# Altium footprint library PLC1.PcbLib: 118 footprints (part 8 of 8)
Each footprint in its own frame and in the unit in brackets; x right, y up, seen from the top. Pads: shape width x height; smd on the part's side, far side on the other; paste and mask are expansions set on the pad; w line width, h text height; cw(c..) or ccw(c..) is an arc to the next point about the centre after c.
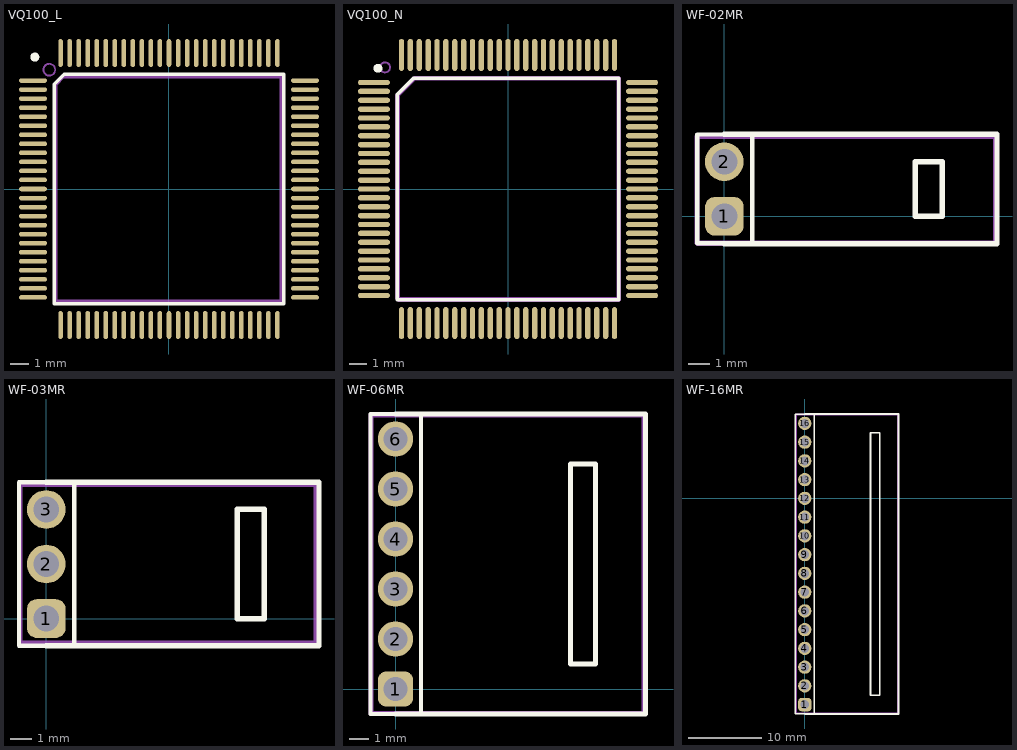
[diagram p7: the footprints below, top view; thin cyan lines are the x and y axes]

## VQ100_L [mm] "100-Pin Very Thin Quad Flat Pack (VQ100), IPC High Density"
height 1.2
pads (100):
  oval 1.55x0.25 smd: 1(-7.525,6) 2(-7.525,5.5) 3(-7.525,5) 4(-7.525,4.5) 5(-7.525,4) 6(-7.525,3.5) 7(-7.525,3) 8(-7.525,2.5) 9(-7.525,2) 10(-7.525,1.5) 11(-7.525,1) 12(-7.525,0.5) 13(-7.525,0) 14(-7.525,-0.5) 15(-7.525,-1) 16(-7.525,-1.5) 17(-7.525,-2) 18(-7.525,-2.5) 19(-7.525,-3) 20(-7.525,-3.5) 21(-7.525,-4) 22(-7.525,-4.5) 23(-7.525,-5) 24(-7.525,-5.5) 25(-7.525,-6) 51(7.525,-6) 52(7.525,-5.5) 53(7.525,-5) 54(7.525,-4.5) 55(7.525,-4) 56(7.525,-3.5) 57(7.525,-3) 58(7.525,-2.5) 59(7.525,-2) 60(7.525,-1.5) 61(7.525,-1) 62(7.525,-0.5) 63(7.525,0) 64(7.525,0.5) 65(7.525,1) 66(7.525,1.5) 67(7.525,2) 68(7.525,2.5) 69(7.525,3) 70(7.525,3.5) 71(7.525,4) 72(7.525,4.5) 73(7.525,5) 74(7.525,5.5) 75(7.525,6)
  oval 0.25x1.55 smd: 26(-6,-7.525) 27(-5.5,-7.525) 28(-5,-7.525) 29(-4.5,-7.525) 30(-4,-7.525) 31(-3.5,-7.525) 32(-3,-7.525) 33(-2.5,-7.525) 34(-2,-7.525) 35(-1.5,-7.525) 36(-1,-7.525) 37(-0.5,-7.525) 38(0,-7.525) 39(0.5,-7.525) 40(1,-7.525) 41(1.5,-7.525) 42(2,-7.525) 43(2.5,-7.525) 44(3,-7.525) 45(3.5,-7.525) 46(4,-7.525) 47(4.5,-7.525) 48(5,-7.525) 49(5.5,-7.525) 50(6,-7.525) 76(6,7.525) 77(5.5,7.525) 78(5,7.525) 79(4.5,7.525) 80(4,7.525) 81(3.5,7.525) 82(3,7.525) 83(2.5,7.525) 84(2,7.525) 85(1.5,7.525) 86(1,7.525) 87(0.5,7.525) 88(0,7.525) 89(-0.5,7.525) 90(-1,7.525) 91(-1.5,7.525) 92(-2,7.525) 93(-2.5,7.525) 94(-3,7.525) 95(-3.5,7.525) 96(-4,7.525) 97(-4.5,7.525) 98(-5,7.525) 99(-5.5,7.525) 100(-6,7.525)
Top Overlay:
  circle w0.25: c-7.425,7.3 r0.125
  lines w0.2: -6.35,-6.35 6.35,-6.35 6.35,6.35 -5.8,6.35 -6.35,5.8 -6.35,-6.35
Top Assy:
  circle w0.1: c-6.625,6.6 r0.326
  lines w0.254: -6.3,-6.225 -6.275,-6.25 6.25,-6.25 6.25,6.225 6.225,6.25 -5.85,6.25 -6.3,5.8 -6.3,5.775 -6.3,-6.225
  text ".Designator" at -3.425,-0.15 h0.7

## VQ100_N [mm] "100-Pin Very Thin Quad Flat Pack (VQ100), IPC Medium Density"
height 1.2
pads (100):
  oval 1.8x0.3 smd: 1(-7.55,6) 2(-7.55,5.5) 3(-7.55,5) 4(-7.55,4.5) 5(-7.55,4) 6(-7.55,3.5) 7(-7.55,3) 8(-7.55,2.5) 9(-7.55,2) 10(-7.55,1.5) 11(-7.55,1) 12(-7.55,0.5) 13(-7.55,0) 14(-7.55,-0.5) 15(-7.55,-1) 16(-7.55,-1.5) 17(-7.55,-2) 18(-7.55,-2.5) 19(-7.55,-3) 20(-7.55,-3.5) 21(-7.55,-4) 22(-7.55,-4.5) 23(-7.55,-5) 24(-7.55,-5.5) 25(-7.55,-6) 51(7.55,-6) 52(7.55,-5.5) 53(7.55,-5) 54(7.55,-4.5) 55(7.55,-4) 56(7.55,-3.5) 57(7.55,-3) 58(7.55,-2.5) 59(7.55,-2) 60(7.55,-1.5) 61(7.55,-1) 62(7.55,-0.5) 63(7.55,0) 64(7.55,0.5) 65(7.55,1) 66(7.55,1.5) 67(7.55,2) 68(7.55,2.5) 69(7.55,3) 70(7.55,3.5) 71(7.55,4) 72(7.55,4.5) 73(7.55,5) 74(7.55,5.5) 75(7.55,6)
  oval 0.3x1.8 smd: 26(-6,-7.55) 27(-5.5,-7.55) 28(-5,-7.55) 29(-4.5,-7.55) 30(-4,-7.55) 31(-3.5,-7.55) 32(-3,-7.55) 33(-2.5,-7.55) 34(-2,-7.55) 35(-1.5,-7.55) 36(-1,-7.55) 37(-0.5,-7.55) 38(0,-7.55) 39(0.5,-7.55) 40(1,-7.55) 41(1.5,-7.55) 42(2,-7.55) 43(2.5,-7.55) 44(3,-7.55) 45(3.5,-7.55) 46(4,-7.55) 47(4.5,-7.55) 48(5,-7.55) 49(5.5,-7.55) 50(6,-7.55) 76(6,7.55) 77(5.5,7.55) 78(5,7.55) 79(4.5,7.55) 80(4,7.55) 81(3.5,7.55) 82(3,7.55) 83(2.5,7.55) 84(2,7.55) 85(1.5,7.55) 86(1,7.55) 87(0.5,7.55) 88(0,7.55) 89(-0.5,7.55) 90(-1,7.55) 91(-1.5,7.55) 92(-2,7.55) 93(-2.5,7.55) 94(-3,7.55) 95(-3.5,7.55) 96(-4,7.55) 97(-4.5,7.55) 98(-5,7.55) 99(-5.5,7.55) 100(-6,7.55)
Top Overlay:
  circle w0.25: c-7.325,6.8 r0.125
  lines w0.2: -6.25,-6.25 -6.25,5.3 -5.3,6.25 6.25,6.25 6.25,-6.25 -6.25,-6.25
Top Assy:
  circle w0.1: c-6.925,6.85 r0.283
  lines w0.254: -6.225,-6.15 -6.225,5.275 -5.25,6.25 6.225,6.25 6.25,6.225 6.25,-6.225 -6.15,-6.225 -6.225,-6.15
  text ".Designator" at -3.65,-0.175 h0.7

## WF-02MR [mm] "WF-02MR"
height 5.8
pads (2):
  rrect50% 1.8x1.8 hole 1.2: 1(0,0)
  round 1.8 hole 1.2: 2(0,2.54)
Top Overlay:
  lines w0.2: -1.27,-1.26 -1.27,3.81 1.3,3.81 1.3,-1.26 -1.27,-1.26
  lines w0.254: 0,-1.27 12.7,-1.27 12.7,3.81 0,3.81 ; 8.89,0 10.16,0 10.16,2.54 8.89,2.54 8.89,0
Top Assy:
  lines w0.254: -1.275,3.7 -1.275,-1.225 -1.25,-1.25 12.65,-1.25 12.65,3.725 -1.15,3.725
  text ".Designator" at 1.6,0.9 h0.7
3D body "User Library-PLS-1R.step": height 5.45, standoff -3, extent -1.27,1.27 7.35,3.81
3D body "User Library-PLS-1R.step": height 5.45, standoff -3, extent -1.27,-1.28 7.35,1.26

## WF-03MR [mm] "WF-03MR"
height 5.8
pads (3):
  rrect50% 1.8x1.8 hole 1.2: 1(0,0)
  round 1.8 hole 1.2: 2(0,2.54) 3(0,5.08)
Top Overlay:
  lines w0.2: 0,6.35 -1.27,6.35 -1.27,-1.26 1.3,-1.26 1.3,6.35
  lines w0.254: 0,-1.27 12.7,-1.27 12.7,6.35 0,6.35 ; 8.89,0 10.16,0 10.16,5.08 8.89,5.08 8.89,0
Top Assy:
  lines w0.254: -1.225,-1.1 -1.225,6.25 12.525,6.25 12.575,6.2 12.575,6.1 12.575,-1.15 -1.175,-1.15 -1.225,-1.1
  text ".Designator" at 1.6,2.3 h0.7
3D body "User Library-PLS-1R.step": height 5.45, standoff -3, extent -1.27,1.27 7.35,3.81
3D body "User Library-PLS-1R.step": height 5.45, standoff -3, extent -1.27,-1.28 7.35,1.26
3D body "User Library-PLS-1R.step": height 5.45, standoff -3, extent -1.27,3.81 7.35,6.35

## WF-06MR [mm] "WF-06MR"
height 5.8
pads (6):
  rrect50% 1.8x1.8 hole 1.2: 1(0,0)
  round 1.8 hole 1.2: 2(0,2.54) 3(0,5.08) 4(0,7.62) 5(0,10.16) 6(0,12.7)
Top Overlay:
  lines w0.2: -1.27,-1.26 1.3,-1.26 1.3,13.97 -1.27,13.97 -1.27,-1.26
  lines w0.254: 0,-1.27 12.7,-1.27 12.7,13.97 0,13.97 ; 8.89,1.27 8.89,11.43 10.16,11.43 10.16,1.27 8.89,1.27
Top Assy:
  lines w0.254: -1.25,-1.25 -1.25,13.925 12.65,13.925 12.625,13.9 12.625,-1.225 12.6,-1.25 -1.25,-1.25
3D body "User Library-PLS-1R.step": height 5.45, standoff -3, extent -1.27,1.27 7.35,3.81
3D body "User Library-PLS-1R.step": height 5.45, standoff -3, extent -1.27,-1.28 7.35,1.26
3D body "User Library-PLS-1R.step": height 5.45, standoff -3, extent -1.27,3.8 7.35,6.34
3D body "User Library-PLS-1R.step": height 5.45, standoff -3, extent -1.27,6.35 7.35,8.89
3D body "User Library-PLS-1R.step": height 5.45, standoff -3, extent -1.27,11.43 7.35,13.97
3D body "User Library-PLS-1R.step": height 5.45, standoff -3, extent -1.27,8.88 7.35,11.42

## WF-16MR [mm] "WF-16MR"
height 5.8
pads (16):
  rrect50% 1.8x1.8 hole 1.2: 1(0,-27.94)
  round 1.8 hole 1.2: 2(0,-25.4) 3(0,-22.86) 4(0,-20.32) 5(0,-17.78) 6(0,-15.24) 7(0,-12.7) 8(0,-10.16) 9(0,-7.62) 10(0,-5.08) 11(0,-2.54) 12(0,0) 13(0,2.54) 14(0,5.08) 15(0,7.62) 16(0,10.16)
Top Overlay:
  lines w0.2: -1.27,-29.2 -1.27,11.43 1.3,11.43 1.3,-29.2 -1.27,-29.2
  lines w0.254: 0,-29.21 12.7,-29.21 12.7,11.43 0,11.43 ; 8.89,-26.67 10.16,-26.67 10.16,8.89 8.89,8.89 8.89,-26.67
Top Assy:
  lines w0.254: -1.175,-29.075 -1.175,11.35 12.525,11.35 12.6,11.275 12.6,-29.1 -1.15,-29.1 -1.175,-29.075
3D body "c-0640457-16-s-3d.stp": height 5.87, standoff -3.52, extent -0.254,-29.21 10.795,11.43